# Altium footprint library EXPLORER.PcbLib: 252 footprints (part 14 of 16)
Each footprint in its own frame and in the unit in brackets; x right, y up, seen from the top. Pads: shape width x height; smd on the part's side, far side on the other; paste and mask are expansions set on the pad; w line width, h text height; cw(c..) or ccw(c..) is an arc to the next point about the centre after c.
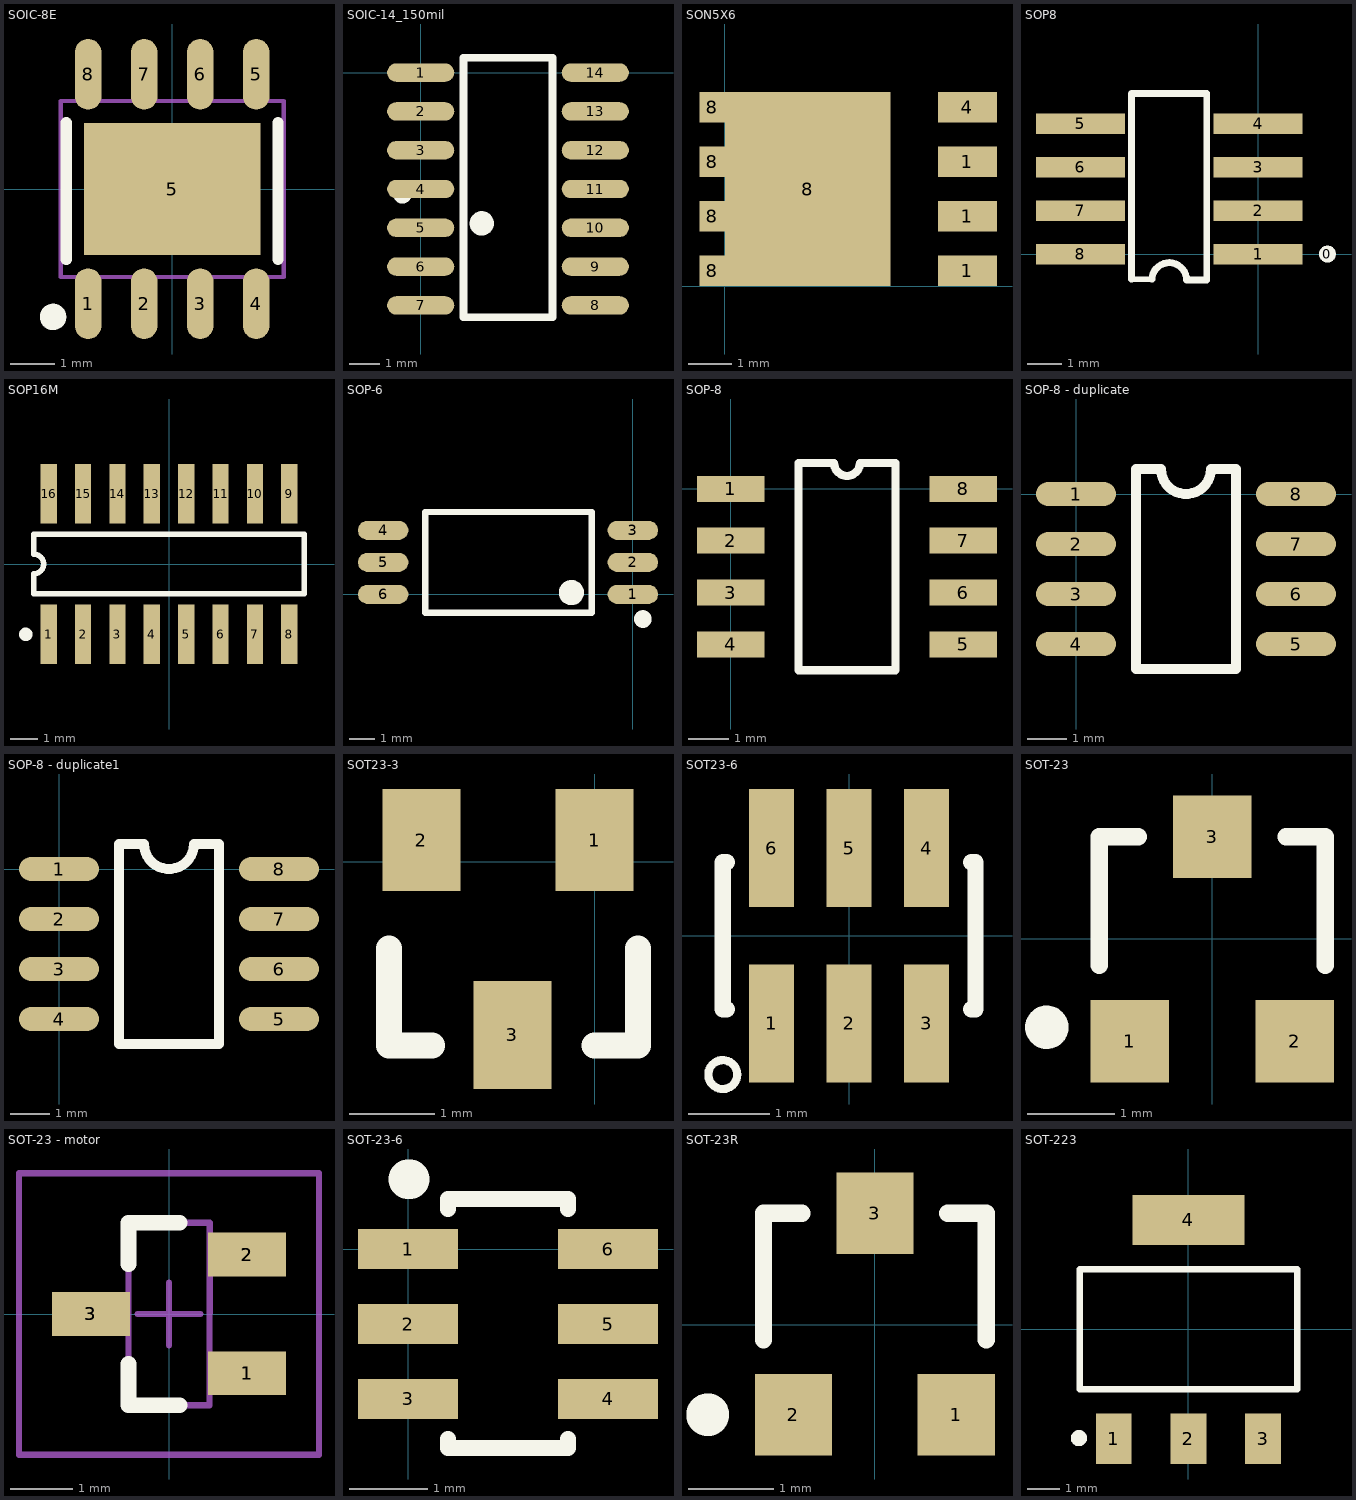
[diagram p13: the footprints below, top view; thin cyan lines are the x and y axes]

## SOIC-8E [mm] "MP1591DN"
pads (9):
  oval 0.6x1.6 smd: 1(-1.905,-2.6) 2(-0.635,-2.6) 3(0.635,-2.6) 4(1.905,-2.6) 5(1.905,2.6) 6(0.635,2.6) 7(-0.635,2.6) 8(-1.905,2.6)
  rect 4x3 smd: 5(0,0)
Top Overlay:
  circle w0.3: c-2.7,-2.9 r0.15
  lines w0.254: -2.4,-1.6 -2.4,1.5 ; 2.4,-1.6 2.4,1.5
Mechanical 13:
  lines w0.1: -2.525,-1.995 2.525,-1.995 2.525,1.995 -2.525,1.995 -2.525,-1.995

## SOIC-14_150mil [mm]
pads (14):
  oval 2.2x0.6 smd: 1(0,0) 2(0,-1.27) 3(0,-2.54) 4(0,-3.81) 5(0,-5.08) 6(0,-6.35) 7(0,-7.62) 8(5.715,-7.62) 9(5.715,-6.35) 10(5.715,-5.08) 11(5.715,-3.81) 12(5.715,-2.54) 13(5.715,-1.27) 14(5.715,0)
Top Overlay:
  circle w0.3: c-0.6,-3.986 r0.15
  circle w0.4: c2,-4.936 r0.2
  lines w0.254: 1.4,-8.01 1.4,0.49 4.318,0.49 4.318,-8.01 1.4,-8.01

## SON5X6 [mm]
pads (9):
  rect 1.372x0.71 smd: 1(5.636,0.355) 1(5.636,1.625) 1(5.636,2.895) 4(5.636,4.165)
  rect 0.59x0.71 smd: 8(-0.295,0.355) 8(-0.295,1.625) 8(-0.295,2.895) 8(-0.295,4.165)
  rect 3.85x4.52 smd: 8(1.925,2.26)

## SOP8 [mm]
height 1.2
pads (9):
  round 0.5 on Top Overlay: 0(2.032,0)
  rect 2.6x0.6 smd: 1(0,0) 2(0,1.27) 3(0,2.54) 4(0,3.81) 5(-5.2,3.81) 6(-5.2,2.54) 7(-5.2,1.27) 8(-5.2,0)
Top Overlay:
  lines w0.152: -3.7,-0.737 -3.108,-0.737
  lines w0.2: -3.7,-0.737 -3.7,4.699 -1.5,4.699 -1.5,-0.762 -2.093,-0.762
  lines w0.203: -3.108,-0.737 cw(c-2.601,-0.76) -2.093,-0.76

## SOP16M [mm]
pads (16):
  rect 0.6x2.2 smd: 1(-4.445,-2.6) 2(-3.175,-2.6) 3(-1.905,-2.6) 4(-0.635,-2.6) 5(0.635,-2.6) 6(1.905,-2.6) 7(3.175,-2.6) 8(4.445,-2.6) 9(4.445,2.6) 10(3.175,2.6) 11(1.905,2.6) 12(0.635,2.6) 13(-0.635,2.6) 14(-1.905,2.6) 15(-3.175,2.6) 16(-4.445,2.6)
Top Overlay:
  circle w0.25: c-5.295,-2.6 r0.125
  lines w0.2: -5,-1.1 -5,-0.367 ccw(c-5,0) -5,0.367 -5,1.1 5,1.1 5,-1.1 -5,-1.1

## SOP-6 [mm]
pads (6):
  oval 2x0.76 smd: 1(0,0) 2(0,1.27) 3(0,2.54) 4(-9.906,2.54) 5(-9.906,1.27) 6(-9.906,0)
Top Overlay:
  circle w0.4: c0.4,-0.98 r0.15
  circle w0.5: c-2.437,0.07 r0.25
  lines w0.254: -8.237,-0.73 -8.237,3.27 -1.637,3.27 -1.637,-0.73 -8.237,-0.73

## SOP-8 [mil]
pads (8):
  rect 65x25 smd: 1(0,0) 2(0,-50) 3(0,-100) 4(0,-150) 5(224.41,-150) 6(224.41,-100) 7(224.41,-50) 8(224.41,0)
Top Overlay:
  lines w7.87: 65.37,-175 159.04,-175 159.04,25 124.7,25 cw(c112.2,25) 99.7,25 65.37,25 65.37,-175

## SOP-8 - duplicate [mil]
height 39.37
pads (8):
  oval 80x24 smd: 1(0,0) 2(0,-50) 3(0,-100) 4(0,-150) 5(220,-150) 6(220,-100) 7(220,-50) 8(220,0)
Top Overlay:
  lines w10: 60,-175 160,-175 160,25 135,25 cw(c110,25) 85,25 60,25 60,-175
3D body: height 73.87, standoff -1.02, extent -14.78,-173.25 234.78,23.75

## SOP-8 - duplicate1 [mil]
height 39.37
pads (8):
  oval 80x24 smd: 1(0,0) 2(0,-50) 3(0,-100) 4(0,-150) 5(220,-150) 6(220,-100) 7(220,-50) 8(220,0)
Top Overlay:
  lines w10: 60,-175 60,25 85,25 ccw(c110,25) 135,25 160,25 160,-175 60,-175
3D body: height 73.87, standoff -1.02, extent -14.78,-173.25 234.78,23.75

## SOT23-3 [mil] "ME2108A"
height 47.24
pads (3):
  rect 36x47.24 smd: 1(0,10) 2(-80,10)
  rect 36x50 smd: 3(-38,-80)
Top Overlay:
  lines w12: -95,-40 -95,-85 -75,-85 ; 0,-85 20,-85 20,-40

## SOT23-6 [mm] "SOT-23/SC-74A; 5 Leads; Body 3.1 x 3 mm, inc. leads (LxW max)"
height 1.45
pads (6):
  rect 0.55x1.45 smd: 1(-0.95,-1.075) 2(0,-1.075) 3(0.95,-1.075) 4(0.95,1.075) 5(0,1.075) 6(-0.95,1.075)
Top Overlay:
  circle w0.1: c-1.549,-1.702 r0.177
  lines w0.2: -1.5,-0.9 -1.55,-0.9 -1.55,0.9 -1.5,0.9 ; 1.5,-0.9 1.55,-0.9 1.55,0.9 1.5,0.9
3D body: height 1, standoff 0, extent -1.485,-1.145 1.435,1.195

## SOT-23 [mm]
height 1.1
pads (3):
  rect 0.9x0.95 smd: 1(-0.95,-1.175) 2(0.95,-1.175) 3(0,1.175)
Top Overlay:
  circle w0.25: c-1.903,-1.016 r0.125
  lines w0.2: -1.3,-0.3 -1.3,1.175 -0.85,1.175 ; 0.85,1.175 1.3,1.175 1.3,-0.3

## SOT-23 - motor [mm]
pads (9):
  rect 1.25x0.7 smd: 1(1.25,-0.95) 1(1.25,-0.95) 1(1.25,-0.95) 2(1.25,0.95) 2(1.25,0.95) 2(1.25,0.95) 3(-1.25,0) 3(-1.25,0) 3(-1.25,0)
Top Overlay:
  lines w0.254: -0.65,-0.8 -0.65,-1.46 0.165,-1.46 ; 0.165,1.46 -0.65,1.46 ; -0.65,0.8 -0.65,1.46 ; -0.65,0.8 -0.65,1.46 ; -0.65,0.8 -0.65,1.46
Mechanical 13:
  lines w0.1: -0.65,-1.46 -0.65,1.46 ; -0.65,-1.46 0.65,-1.46 ; -0.65,-1.46 0.65,-1.46 ; -0.65,-1.46 -0.65,1.46 ; -0.65,-1.46 0.65,-1.46 ; -0.65,-1.46 -0.65,1.46 ; -0.65,1.46 0.65,1.46 ; -0.65,1.46 0.65,1.46 ; -0.65,1.46 0.65,1.46 ; 0.65,-1.46 0.65,1.46 ; 0.65,-1.46 0.65,1.46 ; 0.65,-1.46 0.65,1.46
Mechanical 15:
  lines w0.1: -2.4,-2.25 -2.4,2.25 ; -2.4,-2.25 2.4,-2.25 ; -2.4,-2.25 2.4,-2.25 ; -2.4,-2.25 -2.4,2.25 ; -2.4,-2.25 2.4,-2.25 ; -2.4,-2.25 -2.4,2.25 ; -2.4,2.25 2.4,2.25 ; -2.4,2.25 2.4,2.25 ; -2.4,2.25 2.4,2.25 ; -0.5,0 0.5,0 ; -0.5,0 0.5,0 ; -0.5,0 0.5,0 ; 0,-0.5 0,0.5 ; 0,-0.5 0,0.5 ; 0,-0.5 0,0.5 ; 2.4,-2.25 2.4,2.25 ; 2.4,-2.25 2.4,2.25 ; 2.4,-2.25 2.4,2.25
3D body: height 1.3, standoff 0, extent -1.5,-1.5 1.5,1.5
3D body: height 1.3, standoff 0, extent -1.5,-1.5 1.5,1.5
3D body: height 1.3, standoff 0, extent -1.5,-1.5 1.5,1.5

## SOT-23-6 [mil]
pads (6):
  rect 50x20 smd: 1(0,0) 2(0,-37.4) 3(0,-74.8) 4(100,-74.8) 5(100,-37.4) 6(100,0)
Top Overlay:
  lines w8: 20,-95 20,-99.32 80,-99.32 80,-95 ; 20,20 20,25 80,25 80,20
  lines w19.68: 0,35 1,35

## SOT-23R [mm]
pads (3):
  rect 0.9x0.95 smd: 1(0.95,-1.048) 2(-0.95,-1.048) 3(0,1.302)
Top Overlay:
  circle w0.25: c-1.95,-1.048 r0.125
  lines w0.2: -1.3,-0.173 -1.3,1.302 -0.85,1.302 ; 0.85,1.302 1.3,1.302 1.3,-0.173

## SOT-223 [mm]
height 1.8
pads (4):
  rect 1.1x1.55 smd: 1(-2.3,-3.375) 2(0,-3.375) 3(2.3,-3.375)
  rect 3.45x1.55 smd: 4(0,3.375)
Top Overlay:
  circle w0.25: c-3.376,-3.353 r0.125
  lines w0.2: -3.35,-1.85 3.35,-1.85 3.35,1.85 -3.35,1.85 -3.35,-1.85
3D body: height 0.3, standoff 0, extent 1.905,-3.937 2.794,-2.032
3D body: height 0.3, standoff 0, extent -0.508,-3.937 0.381,-2.032
3D body: height 0.3, standoff 0, extent -2.794,-3.937 -1.905,-2.032
3D body: height 0.3, standoff 0, extent -1.651,2.159 1.651,3.429
3D body: height 0.8, standoff 0, extent -3.302,-2.032 3.302,2.159